# Altium footprint library PCB_GENERAL.PcbLib: 226 footprints (part 2 of 15)
Each footprint in its own frame and in the unit in brackets; x right, y up, seen from the top. Pads: shape width x height; smd on the part's side, far side on the other; paste and mask are expansions set on the pad; w line width, h text height; cw(c..) or ccw(c..) is an arc to the next point about the centre after c.
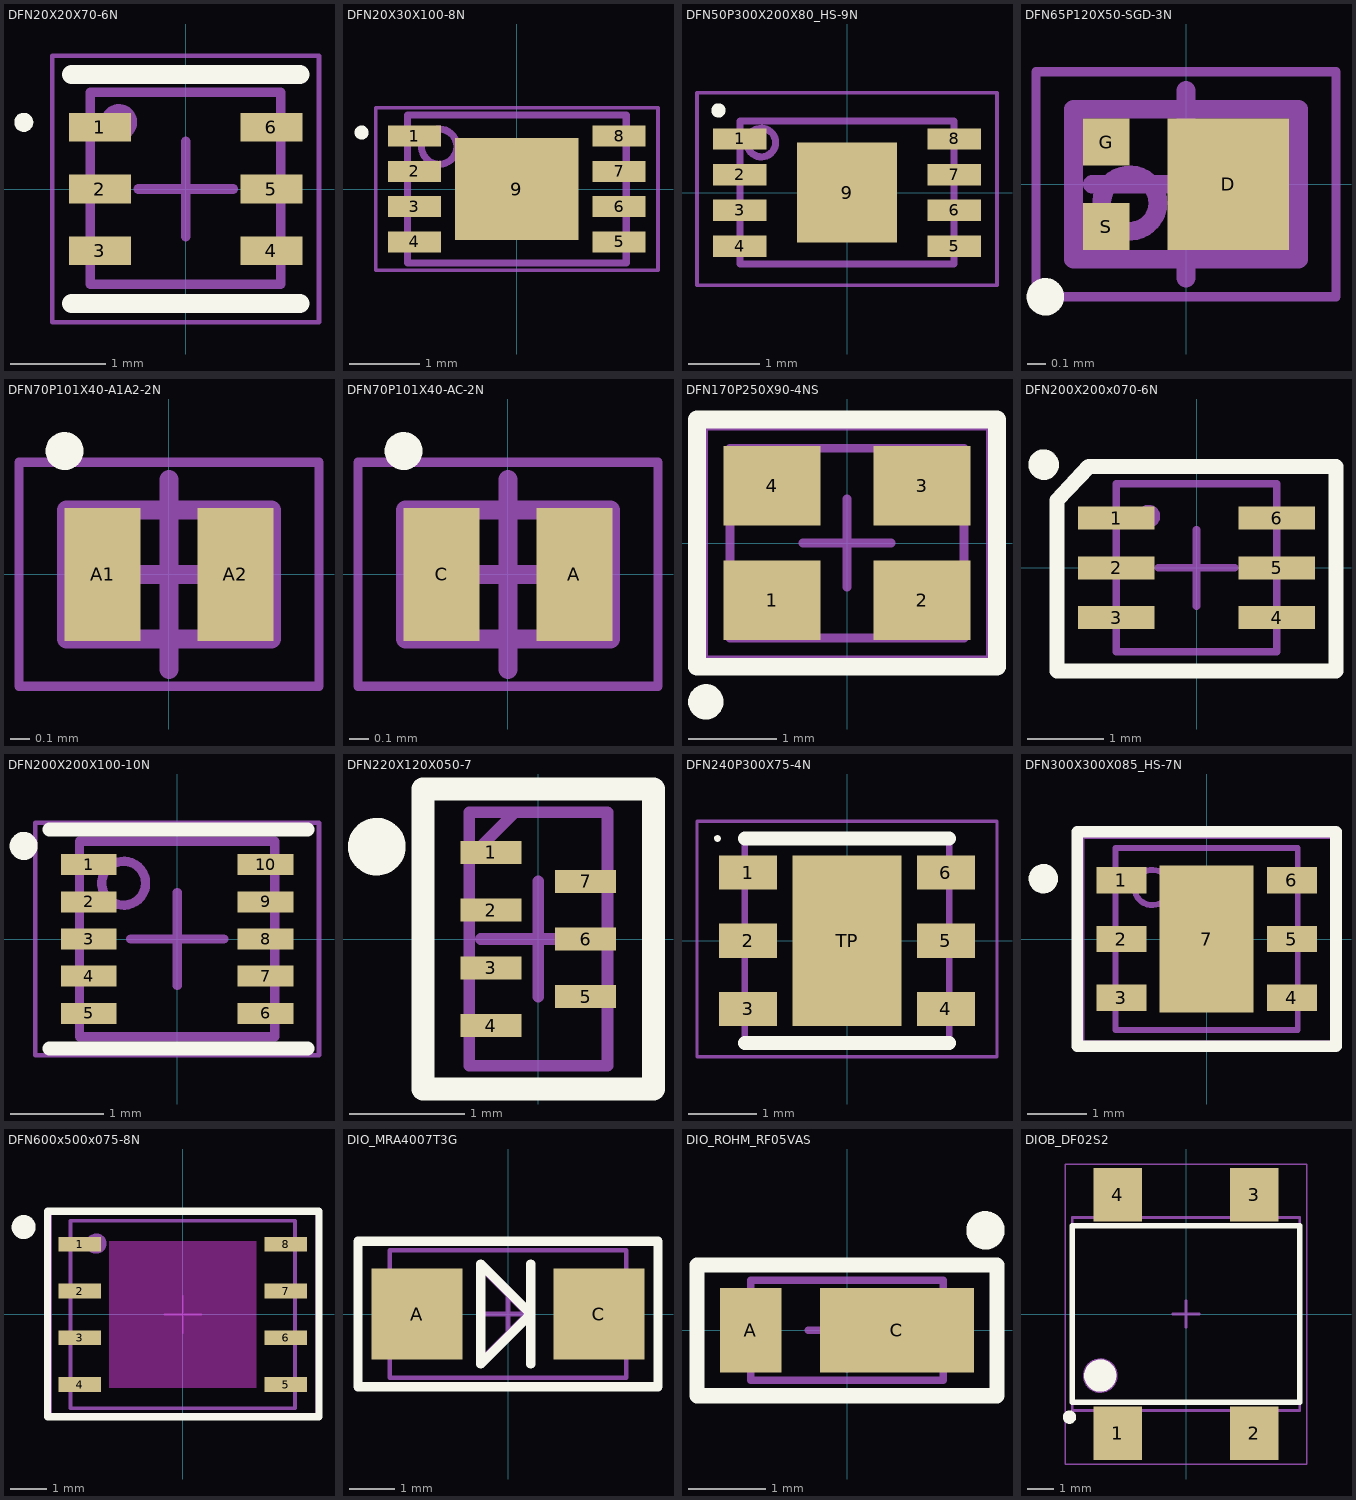
[diagram p1: the footprints below, top view; thin cyan lines are the x and y axes]

## DFN20X20X70-6N [mm] "DFN, 4-Leads, Body 2,00x2,00mm, Pitch 0,65mm, IPC Medium Density"
height 0.7
pads (6):
  rect 0.65x0.3 smd: 1(-0.9,0.65) 2(-0.9,0) 3(-0.9,-0.65) 4(0.9,-0.65) 5(0.9,0) 6(0.9,0.65)
Top Overlay:
  circle w0.1: c-1.7,0.7 r0.05
  lines w0.2: -1.2,-1.2 1.2,-1.2 ; -1.2,1.2 1.2,1.2
Mechanical 11:
  text ".Designator" at -1.2,1.6 h0.3
Mechanical 14:
  circle w0.1: c-0.7,0.7 r0.141
  lines w0.1: -1,-1 -1,1.016 1,1.016 1,-1 -1,-1
Mechanical 15:
  lines w0.05: -1.4,-1.4 -1.4,1.4 1.4,1.4 1.4,-1.4 -1.4,-1.4
  lines w0.1: -0.5,0 0.5,0 ; 0,-0.5 0,0.5
3D body "User Library-APDS-9007.STEP": height 0.85, standoff 0, extent -1,-1.2 1,1.2

## DFN20X30X100-8N [mm] "SON, 8-Leads, Body 2x3mm, Pitch 0.5mm, Microchip Recommended"
height 1
pads (9):
  rect 0.75x0.3 smd: 1(-1.45,0.75) 2(-1.45,0.25) 3(-1.45,-0.25) 4(-1.45,-0.75) 5(1.45,-0.75) 6(1.45,-0.25) 7(1.45,0.25) 8(1.45,0.75)
  rect 1.75x1.45 smd: 9(0,0)
Top Overlay:
  circle w0.1: c-2.2,0.8 r0.05
Mechanical 11:
  text ".Designator" at -1.4,1.4 h0.3
Mechanical 14:
  circle w0.1: c-1.1,0.6 r0.25
  lines w0.1: -1.55,-1.05 1.55,-1.05 1.55,1.05 -1.55,1.05 -1.55,-1.05
Mechanical 15:
  lines w0.05: -0.5,0 0.5,0 ; 0,-0.5 0,0.5 ; -2,-1.15 2,-1.15 2,1.15 -2,1.15 -2,-1.15
3D body "User Library-DFN-8-1.STEP": height 0.8, standoff 0, extent -1.55,-1 1.55,1

## DFN50P300X200X80_HS-9N [mm] "DFN, 8-Leads, Body 3.00x2.00mm, Pitch 0.50mm, Thermal Pad 1.40x1.40mm, IPC Medium Density"
height 0.8
pads (9):
  rect 0.75x0.3 smd: 1(-1.5,0.75) 2(-1.5,0.25) 3(-1.5,-0.25) 4(-1.5,-0.75) 5(1.5,-0.75) 6(1.5,-0.25) 7(1.5,0.25) 8(1.5,0.75)
  rect 1.4x1.4 smd: 9(0,0)
Top Overlay:
  circle w0.1: c-1.8,1.15 r0.05
Mechanical 11:
  text ".Designator" at -1.5,0 h0.3
Mechanical 14:
  circle w0.1: c-1.2,0.7 r0.2
  lines w0.1: -1.5,-1 1.5,-1 1.5,1 -1.5,1 -1.5,-1
Mechanical 15:
  lines w0.05: -2.1,-1.3 2.1,-1.3 2.1,1.4 -2.1,1.4 -2.1,-1.3
  lines w0.1: -0.5,0 0.5,0 ; 0,-0.5 0,0.5
3D body: height 0.8, standoff 0, extent -1.5,-1 1.5,1

## DFN65P120X50-SGD-3N [mm] "DFN, 3-Leads, Body 0,80x1,20mm, Pitch 0,65mm, IPC Medium Density"
height 0.5
pads (3):
  rect 0.65x0.7 smd: D(0.225,0)
  rect 0.25x0.25 smd: G(-0.425,0.225) S(-0.425,-0.225)
Top Overlay:
  circle w0.1: c-0.75,-0.6 r0.05
Mechanical 11:
  text ".Designator" at -0.6,-0.25 h1
Mechanical 14:
  circle w0.1: c-0.3,-0.1 r0.15
  lines w0.1: -0.6,-0.4 0.6,-0.4 0.6,0.4 -0.6,0.4 -0.6,-0.4
Mechanical 15:
  lines w0.05: -0.8,-0.6 0.8,-0.6 0.8,0.6 -0.8,0.6 -0.8,-0.6
  lines w0.1: -0.5,0 0.5,0 ; 0,-0.5 0,0.5
3D body: height 0.5, standoff 0.05, extent -0.625,-0.425 0.625,0.425

## DFN70P101X40-A1A2-2N [mm] "DFN, 2-Leads, Body 0,61x1,01mm, Pitch 0,70mm, IPC Medium Density"
height 0.4
pads (2):
  rect 0.4x0.7 smd: A1(-0.35,0) A2(0.35,0)
Top Overlay:
  circle w0.1: c-0.55,0.65 r0.05
Mechanical 11:
  text ".Designator" at -0.69,-0.29 h1
Mechanical 14:
  lines w0.1: -0.33,-0.34 -0.33,0.34 ; -0.54,-0.34 -0.54,0.34 0.54,0.34 0.54,-0.34 -0.54,-0.34
Mechanical 15:
  lines w0.05: -0.79,-0.59 -0.79,0.59 0.79,0.59 0.79,-0.59 -0.79,-0.59
  lines w0.1: -0.5,0 0.5,0 ; 0,-0.5 0,0.5
3D body: height 0.4, standoff 0.05, extent -0.54,-0.34 0.54,0.34

## DFN70P101X40-AC-2N [mm] "DFN, 2-Leads, Body 0,61x1,01mm, Pitch 0,70mm, IPC Medium Density"
height 0.4
pads (2):
  rect 0.4x0.7 smd: A(0.35,0) C(-0.35,0)
Top Overlay:
  circle w0.1: c-0.55,0.65 r0.05
Mechanical 11:
  text ".Designator" at -0.69,-0.29 h1
Mechanical 14:
  lines w0.1: -0.33,-0.34 -0.33,0.34 ; -0.54,-0.34 -0.54,0.34 0.54,0.34 0.54,-0.34 -0.54,-0.34
Mechanical 15:
  lines w0.05: -0.79,-0.59 -0.79,0.59 0.79,0.59 0.79,-0.59 -0.79,-0.59
  lines w0.1: -0.5,0 0.5,0 ; 0,-0.5 0,0.5
3D body: height 0.4, standoff 0.05, extent -0.54,-0.34 0.54,0.34

## DFN170P250X90-4NS [mm]
height 0.9
pads (4):
  rect 1.1x0.9 smd: 1(-0.85,-0.65) 2(0.85,-0.65) 3(0.85,0.65) 4(-0.85,0.65)
Top Overlay:
  circle w0.25: c-1.6,-1.8 r0.075
  lines w0.2: -1.7,-1.4 -1.7,1.4 1.7,1.4 1.7,-1.4 -1.7,-1.4
Mechanical 11:
  text ".Designator" at -1.6,-0.3 h1
Mechanical 14:
  circle w0.1: c-0.8,-0.6 r0.3
  lines w0.1: -1.325,-1.075 -1.325,1.075 1.325,1.075 1.325,-1.075 -1.325,-1.075
Mechanical 15:
  lines w0.05: -1.6,-1.3 1.6,-1.3 1.6,1.3 -1.6,1.3 -1.6,-1.3
  lines w0.1: -0.5,0 0.5,0 ; 0,-0.5 0,0.5
3D body "User Library-CTS625.STEP": height 1, standoff 0, extent -1.25,-1 1.25,1

## DFN200X200x070-6N [mm] "6-Leads, Pitch 0,65mm,  Body 2,00x2,00mm,  IPC Medium Density"
height 0.7
pads (6):
  rect 1x0.3 smd: 1(-1.05,0.65) 2(-1.05,0) 3(-1.05,-0.65) 4(1.05,-0.65) 5(1.05,0) 6(1.05,0.65)
Top Overlay:
  circle w0.2: c-2,1.35 r0.1
  lines w0.2: -1.825,-1.35 -1.825,0.885 -1.41,1.325 1.825,1.325 1.825,-1.35 -1.825,-1.35
Mechanical 11:
  text ".Designator" at -1.875,1.725 h1
Mechanical 14:
  circle w0.1: c-0.625,0.675 r0.1
  lines w0.1: -1.05,-1.1 1.05,-1.1 1.05,1.1 -1.05,1.1 -1.05,-1.1
Mechanical 15:
  lines w0.05: -1.775,-1.3 -1.775,0.9 -1.35,1.325 1.775,1.325 1.775,-1.3 -1.775,-1.3
  lines w0.1: -0.5,0 0.5,0 ; 0,-0.5 0,0.5
3D body: height 0.7, standoff 0, extent -1.1,-1.1 1.1,1.1

## DFN200X200X100-10N [mm] "Dual-Flat No Lead, 10-Leads, Pitch 0,40mm,  Body 2,00x2,00mm,  IPC Medium Density"
height 1
pads (10):
  rect 0.6x0.225 smd: 1(-0.95,0.8) 2(-0.95,0.4) 3(-0.95,0) 4(-0.95,-0.4) 5(-0.95,-0.8) 6(0.95,-0.8) 7(0.95,-0.4) 8(0.95,0) 9(0.95,0.4) 10(0.95,0.8)
Top Overlay:
  circle w0.2: c-1.65,1 r0.05
  lines w0.15: -1.375,-1.175 1.4,-1.175 ; -1.375,1.175 1.4,1.175
Mechanical 11:
  text ".Designator" at -1.2,1.675 h1
Mechanical 14:
  circle w0.1: c-0.575,0.6 r0.236
  lines w0.1: -1.05,-1.05 1.05,-1.05 1.05,1.05 -1.05,1.05 -1.05,-1.05
Mechanical 15:
  lines w0.05: -1.525,-1.25 1.525,-1.25 1.525,1.25 -1.525,1.25 -1.525,-1.25
  lines w0.1: -0.5,0 0.5,0 ; 0,-0.5 0,0.5
3D body: height 1, standoff 0, extent -1.05,-1.05 1.05,1.05

## DFN220X120X050-7 [mm] "DFN, 7-Leads, Body 2,20x1,20mm, Pitch 0,5mm, IPC Medium Density"
height 0.5
pads (7):
  rect 0.53x0.2 smd: 1(-0.41,0.75) 2(-0.41,0.25) 3(-0.41,-0.25) 4(-0.41,-0.75) 5(0.41,-0.5) 6(0.41,0) 7(0.41,0.5)
Top Overlay:
  circle w0.25: c-1.4,0.8 r0.125
  lines w0.2: -1,-1.3 -1,1.3 1,1.3 1,-1.3 -1,-1.3
Mechanical 11:
  text ".Designator" at -0.635,1.778 h1
Mechanical 14:
  lines w0.1: -0.6,0.3 -0.6,0.4 ; -0.6,0.7 -0.2,1.1 ; -0.6,-1.1 -0.6,1.1 0.6,1.1 0.6,-1.1 -0.6,-1.1
Mechanical 15:
  lines w0.05: -1,-1.3 -1,1.3 1,1.3 1,-1.3 -1,-1.3
  lines w0.1: -0.5,0 0.5,0 ; 0,-0.5 0,0.5
3D body "User Library-SOT833-1 (XSON8).step": height 0.46, standoff -0.04, extent -0.55,-1 0.5,1

## DFN240P300X75-4N [mm] "DFN, 4-Leads, Body 3,00x3,00mm, Pitch 2,40mm, IPC Medium Density"
height 0.75
pads (7):
  rect 0.85x0.5 smd: 1(-1.45,1) 2(-1.45,0) 3(-1.45,-1) 4(1.45,-1) 5(1.45,0) 6(1.45,1)
  rect 1.6x2.5 smd: TP(0,0)
Top Overlay:
  circle w0.1: c-1.9,1.5 r0
  lines w0.2: -1.5,-1.5 1.5,-1.5 ; -1.5,1.5 1.5,1.5
Mechanical 11:
  text ".Designator" at -0.275,2.225 h0.76
Mechanical 14:
  lines w0.1: -1.5,-1.5 1.5,-1.5 1.5,1.5 -1.5,1.5 -1.5,-1.5
Mechanical 15:
  lines w0.05: -2.2,-1.7 2.2,-1.7 2.2,1.75 -2.2,1.75 -2.2,-1.7
  lines w0.1: -0.5,0 0.5,0 ; 0,-0.5 0,0.5
3D body: height 1, standoff 0.1, extent -1.5,-1.75 1.5,1.75

## DFN300X300X085_HS-7N [mm] "DFN, 7-Leads, Body 3,00x3,00mm, Pitch 1,00mm, Thermal Pad 1,60x2,50mm, IPC Medium Density"
height 0.85
pads (7):
  rect 0.85x0.45 smd: 1(-1.45,1) 2(-1.45,0) 3(-1.45,-1) 4(1.45,-1) 5(1.45,0) 6(1.45,1)
  rect 1.6x2.5 smd: 7(0,0)
Top Overlay:
  circle w0.25: c-2.775,1.025 r0.125
  lines w0.2: -2.2,-1.825 -2.2,-1.375 -2.2,1.375 -2.2,1.825 -1.725,1.825 1.725,1.825 2.2,1.825 2.2,1.375 2.2,-1.375 2.2,-1.825 1.725,-1.825 -1.725,-1.825 -2.2,-1.825
Mechanical 11:
  text ".Designator" at -1.175,2.275 h1
Mechanical 14:
  circle w0.1: c-0.925,0.875 r0.3
  lines w0.1: -1.55,-1.55 1.55,-1.55 1.55,1.55 -1.55,1.55 -1.55,-1.55
Mechanical 15:
  lines w0.05: -2.1,-1.75 2.15,-1.75 2.15,1.725 -2.1,1.725 -2.1,-1.75
  lines w0.1: -0.5,0 0.5,0 ; 0,-0.5 0,0.5
3D body "User Library-dfn6_3x3_rm0_95.STEP": height 0.85, standoff 0.05, extent -1.55,-1.5 1.55,1.5

## DFN600x500x075-8N [mm] "Dual Flat No Lead, 8-Leads, Pitch 1.27mm, Body 6,00x5,00mm,Thermal Pad 4.4x4.4mm,  IPC Medium Density"
height 0.75
pads (8):
  rect 1.15x0.4 smd: 1(-2.8,1.905) 2(-2.8,0.635) 3(-2.8,-0.635) 4(-2.8,-1.905) 5(2.8,-1.905) 6(2.8,-0.635) 7(2.8,0.635) 8(2.8,1.905)
Top Overlay:
  circle w0.4: c-4.325,2.375 r0.125
  lines w0.2: -3.675,-2.775 -3.675,2.8 2.075,2.8 3.7,2.8 3.7,-2.775 2.425,-2.775 -3.675,-2.775
Keep-Out Layer:
  rectangle: -2,-2 2,2
Mechanical 11:
  text ".Designator" at -3.375,3.325 h1
Mechanical 14:
  circle w0.15: c-2.35,1.925 r0.2
  lines w0.1: -3.05,-2.55 3.05,-2.55 3.05,2.55 -3.05,2.55 -3.05,-2.55
Mechanical 15:
  lines w0.05: -0.5,0 0.5,0 ; 0,-0.5 0,0.5 ; -3.575,-2.7 -3.575,2.75 3.627,2.75 3.627,-2.7 -3.575,-2.7
3D body "User Library-DFN8-5X6.STEP": height 0.95, standoff 0, extent -3.05,-2.5 3.05,2.5

## DIO_MRA4007T3G [mm]
height 2.2
pads (2):
  rect 2x2 smd: A(-2,0) C(2,0)
Top Overlay:
  lines w0.2: 0.5,-1.1 0.5,1.1 ; 0.5,0 -0.6,-1.1 -0.6,1.1 0.5,0 ; 0.5,0 0.5,0 ; 0.5,0 0.5,0 ; -3.3,-1.6 3.3,-1.6 3.3,1.6 -3.3,1.6 -3.3,-1.6
Mechanical 11:
  text ".Designator" at -2.7,-0.4 h1
Mechanical 14:
  lines w0.1: 0.5,-1 0.5,1 ; -2.6,-1.4 -2.6,1.4 2.6,1.4 2.6,-1.4 -2.6,-1.4 ; -0.6,-1 -0.6,1 0.4,0 -0.6,-1
Mechanical 15:
  lines w0.05: -3.3,-1.6 -3.3,1.6 3.3,1.6 3.3,-1.6 -3.3,-1.6
  lines w0.1: -0.5,0 0.5,0 ; 0,-0.5 0,0.5
3D body "User Library-403D-02(SMA).STEP": height 2.31, standoff 0.01, extent -2.6,-1.45 2.6,1.45

## DIO_ROHM_RF05VAS [mm] "SMD Diode, TUMD2 package"
height 0.8
pads (2):
  rect 0.8x1.1 smd: A(-1.25,0)
  rect 2x1.1 smd: C(0.65,0)
Top Overlay:
  circle w0.25: c1.8,1.3 r0.125
  lines w0.2: -1.95,-0.85 -1.95,0.85 1.95,0.85 1.95,-0.85 -1.95,-0.85
Mechanical 11:
  text ".Designator" at -0.75,-0.4 h1
Mechanical 14:
  lines w0.1: 0.15,-0.35 0.15,0 ; 0.15,0.35 0.15,0 ; 0.15,0 -0.2,-0.35 -0.2,0.35 0.15,0 ; -1.25,-0.65 -1.25,0.65 1.25,0.65 1.25,-0.65 -1.25,-0.65
Mechanical 15:
  lines w0.05: -1.95,-0.85 -1.95,0.85 1.95,0.85 1.95,-0.85 -1.95,-0.85
  lines w0.1: -0.5,0 0.5,0 ; 0,-0.5 0,0.5
3D body "User Library-TUMD2.STEP": height 0.81, standoff 0, extent -1.25,-0.65 1.25,0.65

## DIOB_DF02S2 [mm]
height 2.6
pads (4):
  rect 1.8x2 smd: 1(-2.55,-4.45) 2(2.55,-4.45) 3(2.55,4.45) 4(-2.55,4.45)
Top Overlay:
  circle w0.25: c-4.35,-3.85 r0.125
  circle w0.6: c-3.2,-2.3 r0.3
  lines w0.2: -4.25,-3.3 -3.6,-3.3 3.5,-3.3 4.25,-3.3 4.25,3.3 3.5,3.3 -3.5,3.3 -4.25,3.3 -4.25,-3.3
Mechanical 11:
  text ".Designator" at -3.3,-0.4 h1
Mechanical 14:
  circle w0.1: c-3.2,-2.3 r0.6
  lines w0.1: -4.25,-3.6 4.25,-3.6 4.25,3.6 2.7,3.6 -4.25,3.6 -4.25,-3.6
Mechanical 15:
  lines w0.05: -4.5,-5.6 -4.5,5.6 4.5,5.6 4.5,-5.6 -4.5,-5.6
  lines w0.1: -0.5,0 0.5,0 ; 0,-0.5 0,0.5
3D body "SW3dPS-SDIP.STEP": height 3.64, standoff 0.01, extent -4.25,-5 4.25,5